# Altium footprint library Selex_PCBLib.PcbLib: 388 footprints (part 1 of 25)
Each footprint in its own frame and in the unit in brackets; x right, y up, seen from the top. Pads: shape width x height; smd on the part's side, far side on the other; paste and mask are expansions set on the pad; w line width, h text height; cw(c..) or ccw(c..) is an arc to the next point about the centre after c.
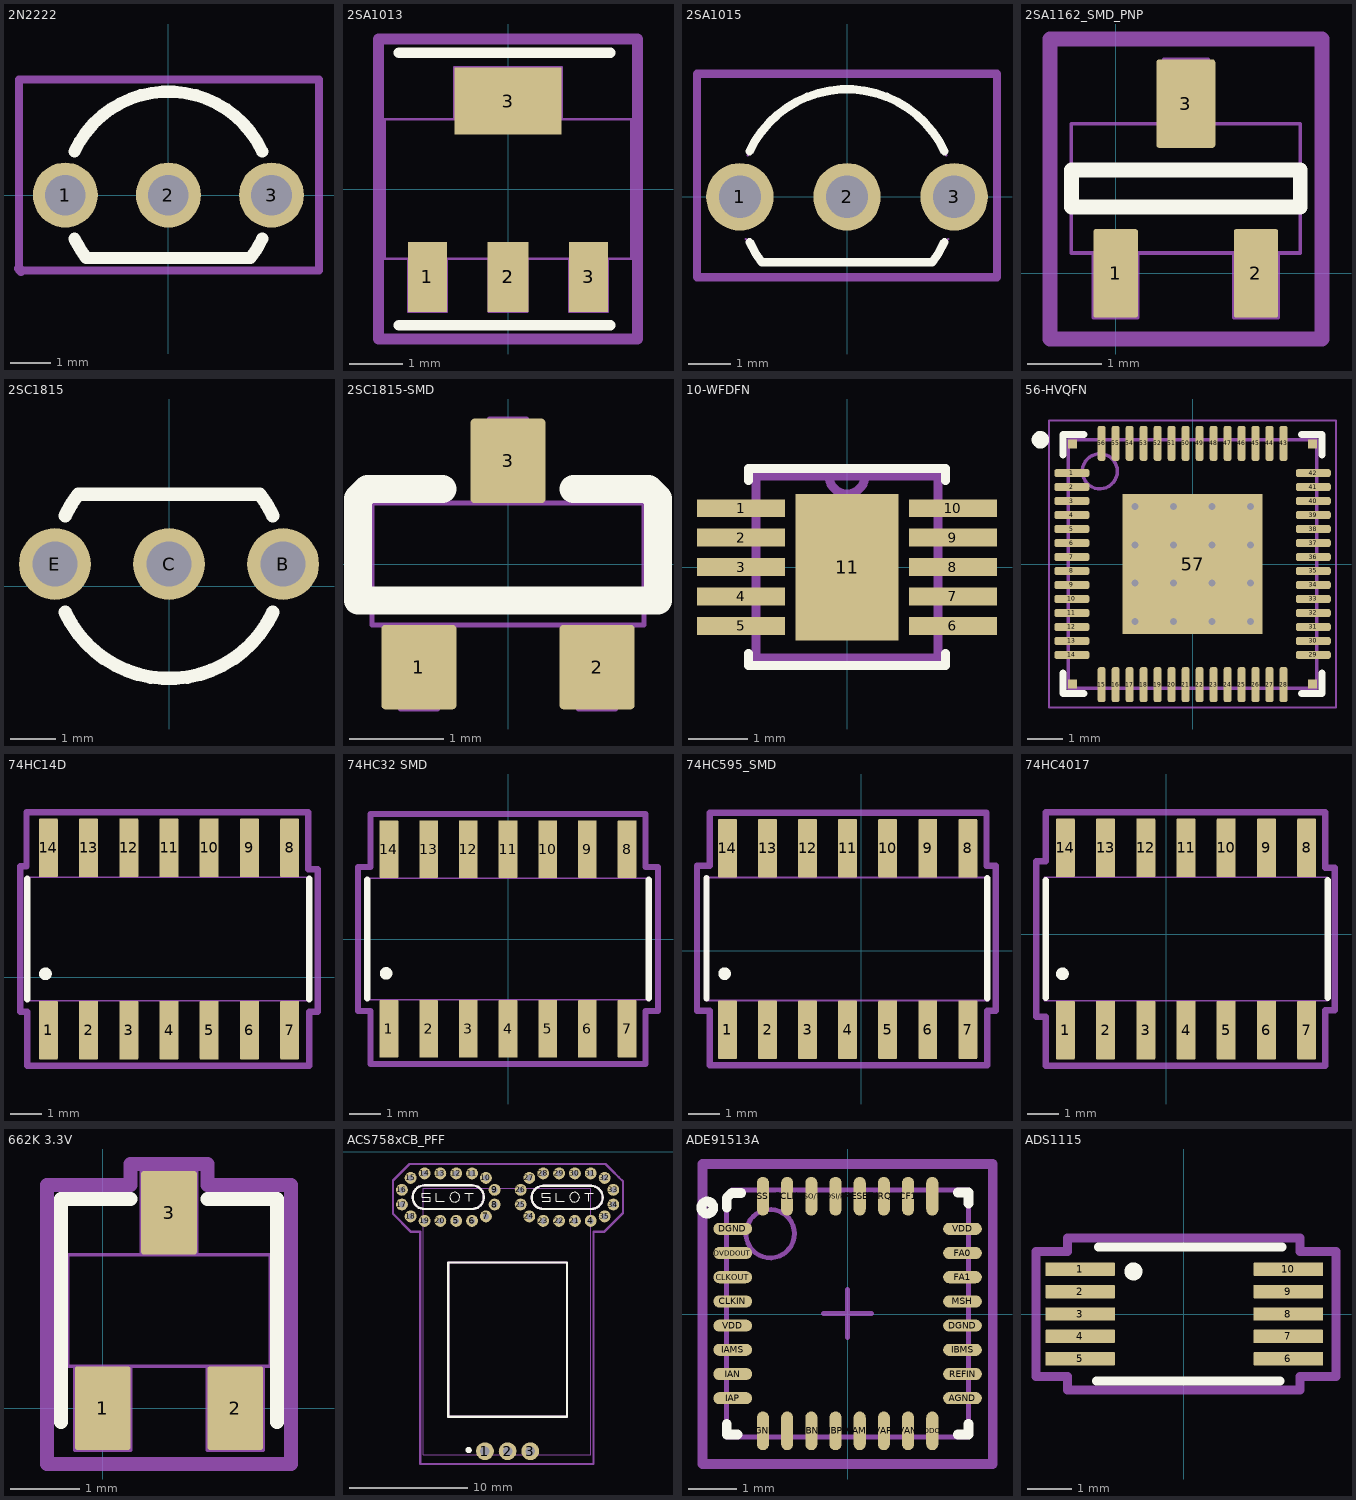
[diagram p0: the footprints below, top view; thin cyan lines are the x and y axes]

## 2N2222 [mm] "NPN transistor"
height 5.33
pads (3):
  round 1.6 hole 1 mask+0.1: 1(-2.54,0) 2(0,0) 3(2.54,0)
Top Overlay:
  lines w0.3: -2.311,-1.078 ccw(c0,0) -2.025,-1.55 2.025,-1.55 ccw(c0,0) 2.311,-1.078 ; -2.311,1.078 cw(c0,0) 2.311,1.078
Mechanical 1:
  circle w0.05: c2.54,0 r0.65
  circle w0.05: c0,0 r0.65
  circle w0.05: c-2.54,0 r0.65
  circle w0.05: c-2.54,0 r0.65
  lines w0.05: -2.4,-1 -2.025,-1.55 2.025,-1.55 2.4,-1 ; -2.354,0.981 cw(c0,0) 2.354,0.981
  text "B" at -0.2,-0.4 h0.8
  text "C" at -2.8,-0.4 h0.8
  text "E" at 2.3,-0.4 h0.8
Mechanical 7:
  lines w0.2: -3.68,-1.81 -3.68,2.85 3.71,2.85 3.71,-1.86 -3.63,-1.86
  lines w0.254: -3.68,-1.81 -3.63,-1.86
3D body "User Library-TO-92_Bent.STEP": height 10, standoff -3, extent -2.79,-1.59 2.79,2.613

## 2SA1013 [mm] "PNP transistor"
height 1.5
pads (5):
  rect 0.72x1.3 smd mask+0.1: 1(-1.5,-1.637) 3(1.5,-1.637)
  rect 0.76x1.3 smd mask+0.1: 2(0,-1.637) 2(0,-1.637)
  rect 2x1.25 smd mask+0.1: 3(0,1.637)
Top Overlay:
  lines w0.2: -2.032,-2.54 1.905,-2.54 ; -2.032,2.54 1.905,2.54
Mechanical 1:
  lines w0.05: -1.86,-1.3 -1.86,-2.288 -1.14,-2.288 -1.14,-1.3 ; -1,1.3 -1,2.262 1,2.262 1,1.3 ; -0.36,-1.3 -0.36,-2.288 0.36,-2.288 0.36,-1.3 ; 1.14,-1.3 1.14,-2.288 1.86,-2.288 1.86,-1.3 ; -2.3,-1.3 2.3,-1.3 2.3,1.3 -2.3,1.3 -2.3,-1.3
  text "B" at -1.9,-0.763 h1.2
  text "C" at -0.4,-0.763 h1.2
  text "E" at 1.1,-0.763 h1.2
Mechanical 15:
  lines w0.2: -2.413,-2.794 2.413,-2.794 2.413,2.794 -2.413,2.794 -2.413,1.111 -2.413,-1.492 -2.413,-2.794
3D body "SOT-89.step": height 1.5, standoff 0, extent -2.25,-1.937 2.25,2.063

## 2SA1015 [mm] "BJT, through"
height 6.5
pads (3):
  round 1.6 hole 1 mask+0.1: 1(-2.54,0) 2(0,0) 3(2.54,0)
Top Overlay:
  lines w0.2: -2.311,-1.078 ccw(c0,0) -2.025,-1.55 2.025,-1.55 ccw(c0,0) 2.311,-1.078 ; -2.311,1.078 cw(c0,0) 2.311,1.078
Mechanical 1:
  circle w0.05: c-2.54,0 r0.65
  circle w0.05: c-2.54,0 r0.65
  circle w0.05: c0,0 r0.65
  circle w0.05: c2.54,0 r0.65
  lines w0.05: -2.4,-1 -2.025,-1.55 2.025,-1.55 2.4,-1 ; -2.354,0.981 cw(c0,0) 2.354,0.981
  text "E" at -2.8,-0.4 h0.8
  text "C" at -0.3,-0.4 h0.8
  text "B" at 2.3,-0.4 h0.8
Mechanical 15:
  lines w0.2: -3.556,-1.905 3.556,-1.905 3.556,2.921 -3.556,2.921 -3.556,-1.905
3D body "User Library-TO-92_Bent.STEP": height 7, standoff -6, extent -2.79,-1.59 2.79,2.613

## 2SA1162_SMD_PNP [mm] "2SA1162,PNP,SMD, TO-236MOD"
height 1.3
pads (3):
  rrect10% 0.6x1.2 smd mask+0.1: 1(0,0) 2(1.9,0)
  rrect10% 0.8x1.2 smd mask+0.1: 3(0.95,2.3)
Top Overlay:
  lines w0.2: -0.6,0.9 -0.6,1.4 2.5,1.4 2.5,0.9 -0.6,0.9
Mechanical 1:
  lines w0.05: -0.6,0.275 -0.6,2.025 2.5,2.025 2.5,0.275 -0.6,0.275 ; -0.3,-0.6 -0.3,0.275 0.3,0.275 0.3,-0.6 -0.3,-0.6 ; 0.65,2.025 1.25,2.025 1.25,2.9 0.65,2.9 0.65,2.025 ; 1.6,-0.6 2.2,-0.6 2.2,0.275 1.6,0.275 1.6,-0.6
  text "E" at 1.591,0.377 h0.8
  text "C" at 0.653,1.083 h0.8
  text "B" at -0.324,0.364 h0.8
Mechanical 15:
  lines w0.2: -0.889,-0.762 -0.889,3.175 2.794,3.175 2.794,-0.889 -0.889,-0.889 -0.889,-0.635
3D body "User Library-SOT95P240X110-3M[SOT23-3_TO-236AB].step": height 1.09, standoff 0, extent -0.552,-0.113 2.448,2.387

## 2SC1815 [mm] "BJT, through"
height 6.5
pads (3):
  round 1.6 hole 1 mask+0.1: B(2.54,0.5) C(0,0.5) E(-2.54,0.5)
Top Overlay:
  lines w0.3: -2.311,-0.578 ccw(c0,0.5) 2.311,-0.578 ; -2.311,1.578 cw(c0,0.5) -2.025,2.05 2.025,2.05 cw(c0,0.5) 2.311,1.578
Mechanical 1:
  circle w0.05: c2.54,0.5 r0.65
  circle w0.05: c2.54,0.5 r0.65
  circle w0.05: c0,0.5 r0.65
  circle w0.05: c-2.54,0.5 r0.65
  lines w0.05: -2.4,1.5 -2.025,2.05 2.025,2.05 2.4,1.5 ; -2.354,-0.481 ccw(c0,0.5) 2.354,-0.481
  text "E" at 2.8,0.9 h0.8
  text "C" at 0.3,0.9 h0.8
  text "B" at -2.3,0.9 h0.8
3D body "User Library-TO-92_Bent.STEP": height 7, standoff -6, extent -2.79,-2.113 2.79,2.09

## 2SC1815-SMD [mm] "NPN-VCE=50V,IC=150mA"
height 1.07
pads (3):
  rrect10% 0.8x0.9 smd mask+0.05: 1(-0.95,-1.1) 2(0.95,-1.1) 3(0,1.1)
Top Overlay:
  lines w0.3: -0.7,0.8 -1.5,0.8 -1.6,0.7 -1.6,-0.39 1.6,-0.39 1.6,0.7 1.5,0.8 0.7,0.8
Mechanical 1:
  lines w0.05: -0.2,0.65 -0.2,1.55 0.2,1.55 0.2,0.65 ; 0.75,-0.65 0.75,-1.55 1.15,-1.55 1.15,-0.65 ; -1.15,-1.55 -1.15,-0.65 -1.15,-1.55 ; -1.15,-1.55 -0.75,-1.55 ; -1.15,-1.55 -0.75,-1.55 ; -0.75,-1.55 -0.75,-0.65 -0.75,-1.55 ; -1.45,-0.65 -1.45,0.65 1.45,0.65 1.45,-0.65 -1.45,-0.65
  text "C" at -0.27,-0.27 h0.8
  text "B" at -1.28,-0.47 h0.8
  text "E" at 0.76,-0.41 h0.8
3D body "User Library-sot-3p290x130ll237h100.step": height 1, standoff 0, extent -1.44,-1.185 1.46,1.185

## 10-WFDFN [mm]
pads (11):
  rect 1.5x0.305 smd: 1(-1.8,1) 2(-1.8,0.5) 3(-1.8,0) 4(-1.8,-0.5) 5(-1.8,-1) 6(1.8,-1) 7(1.8,-0.5) 8(1.8,0) 9(1.8,0.5) 10(1.8,1)
  rect 1.753x2.489 smd paste-2: 11(0,0)
Top Overlay:
  lines w0.152: -1.676,-1.676 1.676,-1.676 ; -1.676,-1.676 -1.676,-1.473 -1.676,-1.676 ; -1.676,-1.676 1.676,-1.676 ; -1.676,1.676 -1.676,1.473 -1.676,1.676 ; -1.676,1.676 1.676,1.676 ; -1.676,1.676 1.676,1.676 ; 1.676,-1.676 1.676,-1.473 1.676,-1.676 ; 1.676,1.676 1.676,1.473 1.676,1.676
Top Paste:
  region: 0.876,-1.245 -0.876,-1.245 -0.876,1.245 0.876,1.245
  region: 0.876,-1.245 -0.876,-1.245 -0.876,1.245 0.876,1.245
Mechanical 13:
  lines w0.152: -1.549,-1.549 -1.549,1.549 ; -1.549,-1.549 1.549,-1.549 ; -1.549,-1.549 1.549,-1.549 ; -1.549,-1.549 -1.549,1.549 ; -1.549,1.549 -0.305,1.549 ; -1.549,1.549 -0.305,1.549 ; -0.305,1.549 ccw(c0,1.549) 0.305,1.549 ; -0.305,1.549 ccw(c0,1.549) 0.305,1.549 ; -0.305,1.549 0.305,1.549 ; -0.305,1.549 0.305,1.549 ; 0.305,1.549 1.549,1.549 ; 0.305,1.549 1.549,1.549 ; 1.549,-1.549 1.549,1.549 ; 1.549,-1.549 1.549,1.549
3D body "LTC3407AEDD#PBF.STEP": height 0.8, standoff 0, extent -1.5,-1.5 1.5,1.5

## 56-HVQFN [mm] "General Purpose PMIC 56-HVQFN (7x7)"
pads (61):
  rrect50% 1x0.22 smd mask+0.05: 1(-3.45,2.6) 2(-3.45,2.2) 3(-3.45,1.8) 4(-3.45,1.4) 5(-3.45,1) 6(-3.45,0.6) 7(-3.45,0.2) 8(-3.45,-0.2) 9(-3.45,-0.6) 10(-3.45,-1) 11(-3.45,-1.4) 12(-3.45,-1.8) 13(-3.45,-2.2) 14(-3.45,-2.6) 29(3.45,-2.6) 30(3.45,-2.2) 31(3.45,-1.8) 32(3.45,-1.4) 33(3.45,-1) 34(3.45,-0.6) 35(3.45,-0.2) 36(3.45,0.2) 37(3.45,0.6) 38(3.45,1) 39(3.45,1.4) 40(3.45,1.8) 41(3.45,2.2) 42(3.45,2.6)
  rrect50% 0.22x1 smd mask+0.05: 15(-2.6,-3.45) 16(-2.2,-3.45) 17(-1.8,-3.45) 18(-1.4,-3.45) 19(-1,-3.45) 20(-0.6,-3.45) 21(-0.2,-3.45) 22(0.2,-3.45) 23(0.6,-3.45) 24(1,-3.45) 25(1.4,-3.45) 26(1.8,-3.45) 27(2.2,-3.45) 28(2.6,-3.45) 43(2.6,3.45) 44(2.2,3.45) 45(1.8,3.45) 46(1.4,3.45) 47(1,3.45) 48(0.6,3.45) 49(0.2,3.45) 50(-0.2,3.45) 51(-0.6,3.45) 52(-1,3.45) 53(-1.4,3.45) 54(-1.8,3.45) 55(-2.2,3.45) 56(-2.6,3.45)
  rect 0.25x0.25 smd mask+0.05: 57(-3.429,-3.429) 57(-3.429,3.429) 57(3.429,-3.429) 57(3.429,3.429)
  rect 4x4 smd mask+0.05: 57(0,0)
via 1.65,-1.65 diameter 0.5 hole 0.2
via 0.55,-1.65 diameter 0.5 hole 0.2
via -0.55,-1.65 diameter 0.5 hole 0.2
via -1.65,-1.65 diameter 0.5 hole 0.2
via 1.65,-0.55 diameter 0.5 hole 0.2
via 0.55,-0.55 diameter 0.5 hole 0.2
via -0.55,-0.55 diameter 0.5 hole 0.2
via -1.65,-0.55 diameter 0.5 hole 0.2
via 1.65,0.55 diameter 0.5 hole 0.2
via 0.55,0.55 diameter 0.5 hole 0.2
via -0.55,0.55 diameter 0.5 hole 0.2
via -1.65,0.55 diameter 0.5 hole 0.2
via 1.65,1.65 diameter 0.5 hole 0.2
via 0.55,1.65 diameter 0.5 hole 0.2
via -0.55,1.65 diameter 0.5 hole 0.2
via -1.65,1.65 diameter 0.5 hole 0.2
Top Overlay:
  circle w0.25: c-4.35,3.55 r0.125
  lines w0.2: -3.7,-3.11 -3.7,-3.7 -3.11,-3.7 ; -3.7,3.11 -3.7,3.7 -3.11,3.7 ; 3.11,-3.7 3.7,-3.7 3.7,-3.11 ; 3.11,3.7 3.7,3.7 3.7,3.11
Bottom Courtyard:
  text ".Comment" at -2.024,-0.055 h1.02
Top Component Outline:
  lines w0.05: -4.1,-4.1 4.1,-4.1 4.1,4.1 -4.1,4.1 -4.1,-4.1
  lines w0.1: -0.5,0 0.5,0 ; 0,-0.5 0,0.5
Top Designator:
  text ".Designator" at -1.815,-0.158 h0.7
Top Assembly:
  circle w0.1: c-2.65,2.65 r0.5
  lines w0.1: -3.55,-3.55 3.55,-3.55 3.55,3.55 -3.55,3.55 -3.55,-3.55
3D body "QFN40P700X700X100_HS-57N.step": height 1, standoff 0, extent -3.551,-3.551 3.551,3.551

## 74HC14D [mm] "74HC14, SO14, SMD."
height 1.75
pads (14):
  rrect10% 0.6x1.85 smd mask+0.05: 1(11.565,-1.675) 2(12.835,-1.675) 3(14.105,-1.675) 4(15.375,-1.675) 5(16.645,-1.675) 6(17.915,-1.675) 7(19.185,-1.675) 8(19.185,4.075) 9(17.915,4.075) 10(16.645,4.075) 11(15.375,4.075) 12(14.105,4.075) 13(12.835,4.075) 14(11.565,4.075)
Top Overlay:
  circle w0.2: c11.475,0.1 r0.1
  lines w0.2: 10.9,-0.7 10.9,3.1 ; 19.8,-0.7 19.8,3.1
Mechanical 1:
  lines w0.05: 10.9,-0.75 10.9,3.15 19.85,3.15 19.85,-0.75 10.9,-0.75
Mechanical 3:
  lines w0.2: 10.675,0.5 10.675,3.5 ; 10.675,3.5 10.875,3.5 10.875,5.2 19.775,5.2 19.775,3.4 20.075,3.4 20.075,-1.1 19.8,-1.1 19.8,-2.8 10.9,-2.8 10.9,-1.1 10.675,-1.1 10.675,3.5
3D body "User Library-SOIC14-150.step": height 1.75, standoff 0, extent 11.1,-1.6 19.65,4.2

## 74HC32 SMD [mm] "Quad 2-input OR Gate, SOIC14"
height 1.75
pads (14):
  rrect10% 0.6x1.85 smd mask+0.05: 1(-3.81,-2.875) 2(-2.54,-2.875) 3(-1.27,-2.875) 4(0,-2.875) 5(1.27,-2.875) 6(2.54,-2.875) 7(3.81,-2.875) 8(3.81,2.875) 9(2.54,2.875) 10(1.27,2.875) 11(0,2.875) 12(-1.27,2.875) 13(-2.54,2.875) 14(-3.81,2.875)
Top Overlay:
  circle w0.2: c-3.9,-1.1 r0.1
  lines w0.2: -4.5,-1.9 -4.5,1.9 ; 4.5,-1.9 4.5,1.9
Mechanical 1:
  lines w0.05: -4.475,-1.95 -4.475,1.95 4.475,1.95 4.475,-1.95 -4.475,-1.95
Mechanical 3:
  lines w0.2: -4.8,-2.3 -4.4,-2.3 -4.4,-4 4.4,-4 4.4,-2.3 4.8,-2.3 4.8,2.3 4.4,2.3 4.4,4 -4.4,4 -4.4,2.3 -4.8,2.3 -4.8,-2.3
3D body "User Library-SOIC14-150.step": height 1.75, standoff 0, extent -4.275,-2.8 4.275,3

## 74HC595_SMD [mm] "SOI-16,SMD"
height 1.7
pads (14):
  rrect10% 0.6x1.85 smd mask+0.05: 1(-4.235,-2.5) 2(-2.965,-2.5) 3(-1.695,-2.5) 4(-0.425,-2.5) 5(0.845,-2.5) 6(2.115,-2.5) 7(3.385,-2.5) 8(3.385,3.25) 9(2.115,3.25) 10(0.845,3.25) 11(-0.425,3.25) 12(-1.695,3.25) 13(-2.965,3.25) 14(-4.235,3.25)
Top Overlay:
  circle w0.2: c-4.325,-0.725 r0.1
  lines w0.2: -4.9,-1.5 -4.9,2.3 ; 4,-1.5 4,2.3
Mechanical 1:
  lines w0.05: -4.9,-1.575 4.05,-1.575 4.05,2.325 -4.9,2.325 -4.9,-1.575
Mechanical 3:
  lines w0.2: -5.2,-1.9 -5.2,2.7 -4.8,2.7 -4.8,4.375 3.975,4.375 3.975,2.7 4.275,2.7 4.275,-1.9 4,-1.9 4,-3.625 -4.8,-3.625 -4.8,-1.9 -5.2,-1.9
3D body "User Library-SOIC14-150.step": height 1.75, standoff 0, extent -4.7,-2.425 3.85,3.375

## 74HC4017 [mm] "SO16-SOT109-1"
height 1.75
pads (14):
  rrect10% 0.6x1.85 smd mask+0.05: 1(-3.185,-3.025) 2(-1.915,-3.025) 3(-0.645,-3.025) 4(0.625,-3.025) 5(1.895,-3.025) 6(3.165,-3.025) 7(4.435,-3.025) 8(4.435,2.725) 9(3.165,2.725) 10(1.895,2.725) 11(0.625,2.725) 12(-0.645,2.725) 13(-1.915,2.725) 14(-3.185,2.725)
Top Overlay:
  circle w0.2: c-3.275,-1.25 r0.1
  lines w0.2: -3.8,-2 -3.8,1.7 ; 5.1,-2 5.1,1.7
Mechanical 1:
  lines w0.05: -3.85,-2.1 -3.85,1.8 5.1,1.8 5.1,-2.1 -3.85,-2.1
Mechanical 3:
  lines w0.2: -4.1,2.3 -4.1,-1.606 -4.1,-2.6 -3.8,-2.6 -3.8,-4.15 5.025,-4.15 5.025,-2.4 5.325,-2.4 5.325,2.1 5.025,2.1 5.025,3.85 -3.8,3.85 -3.8,2.3 -4.075,2.3
3D body "User Library-SOIC14-150.step": height 1.75, standoff 0, extent -3.65,-2.95 4.9,2.85

## 662K 3.3V [mm] "3.3V 0.5A SOT-23"
height 1.3
pads (3):
  rrect10% 0.8x1.2 smd mask+0.05: 1(0,0) 2(1.9,0) 3(0.95,2.8)
Top Overlay:
  lines w0.2: -0.6,-0.2 -0.6,3 0.4,3 ; 1.5,3 2.5,3 2.5,-0.2
Mechanical 1:
  lines w0.05: -0.4,0.6 -0.4,-0.6 0.4,-0.6 0.4,0.6 ; 0.55,2.2 0.55,3.4 1.35,3.4 1.35,2.2 ; 1.5,0.6 1.5,-0.6 2.3,-0.6 2.3,0.6 ; -0.5,0.6 -0.5,2.2 2.4,2.2 2.4,0.6 -0.5,0.6
Mechanical 3:
  lines w0.2: -0.8,-0.8 2.7,-0.8 2.7,-0.4 2.7,3.2 1.5,3.2 1.5,3.5 0.4,3.5 0.4,3.2 -0.8,3.2 -0.8,-0.4 -0.8,-0.8
3D body "User Library-sot-3p290x130ll237h100.step": height 1, standoff 0, extent -0.49,0.065 2.41,2.435

## ACS758xCB_PFF [mm]
pads (35):
  round 1.5 hole 0.8: 1(28.824,-25.21) 2(30.734,-25.21) 3(32.644,-25.21)
  round 1 hole 0.5: 4(37.734,-5.81) 5(26.401,-5.81) 6(27.734,-5.81) 7(28.91,-5.428) 8(29.636,-4.428) 9(29.636,-3.192) 10(28.91,-2.192) 11(27.734,-1.81) 12(26.401,-1.81) 13(25.067,-1.81) 14(23.734,-1.81) 15(22.558,-2.192) 16(21.832,-3.192) 17(21.832,-4.428) 18(22.558,-5.428) 19(23.734,-5.81) 20(25.067,-5.81) 21(36.401,-5.81) 22(35.067,-5.81) 23(33.734,-5.81) 24(32.558,-5.428) 25(31.832,-4.428) 26(31.832,-3.192) 27(32.558,-2.192) 28(33.734,-1.81) 29(35.067,-1.81) 30(36.401,-1.81) 31(37.734,-1.81) 32(38.91,-2.192) 33(39.636,-3.192) 34(39.636,-4.428) 35(38.91,-5.428)
Top Overlay:
  circle w0.1: c36.383,-3.81 r0.41
  circle w0.1: c26.285,-3.81 r0.41
  circle w0.254: c27.449,-25.113 r0.139
  lines w0.1: 23.535,-4.16 24.235,-4.16 24.235,-3.81 23.535,-3.81 23.535,-3.46 24.235,-3.46 ; 24.735,-3.476 24.735,-4.16 25.403,-4.16 ; 27.135,-3.46 27.835,-3.46 ; 27.485,-4.16 27.485,-3.46 ; 33.633,-4.16 34.333,-4.16 34.333,-3.81 33.633,-3.81 33.633,-3.46 34.333,-3.46 ; 34.833,-3.476 34.833,-4.16 35.501,-4.16 ; 37.233,-3.46 37.933,-3.46 ; 37.583,-4.16 37.583,-3.46
  lines w0.2: 23.734,-4.81 cw(c23.734,-3.81) 23.734,-2.81 27.734,-2.81 cw(c27.734,-3.81) 27.734,-4.81 23.734,-4.81 ; 25.734,-22.31 25.734,-9.31 35.734,-9.31 35.734,-22.31 25.734,-22.31 ; 33.734,-4.81 cw(c33.734,-3.832) 33.734,-2.855 37.791,-2.855 cw(c37.762,-3.832) 37.791,-4.81 33.734,-4.81
Mechanical 13:
  lines w0.1: 23.622,-25.527 23.622,-3.048 37.719,-3.048 37.719,-25.527 23.622,-25.527
  lines w0.2: 23.734,-4.81 cw(c23.734,-3.81) 23.734,-2.81 27.734,-2.81 cw(c27.734,-3.81) 27.734,-4.81 23.734,-4.81 ; 25.734,-22.31 25.734,-9.31 35.734,-9.31 35.734,-22.31 25.734,-22.31 ; 33.734,-4.81 cw(c33.734,-3.832) 33.734,-2.855 37.791,-2.855 cw(c37.762,-3.832) 37.791,-4.81 33.734,-4.81
Mechanical 15:
  lines w0.2: 21.082,-5.207 22.606,-6.731 23.368,-6.731 23.368,-8.128 23.368,-26.289 37.973,-26.289 37.973,-8.001 37.973,-7.62 37.973,-6.731 38.862,-6.731 39.688,-5.905 40.45,-5.143 40.45,-4.334 40.45,-3.238 40.45,-2.73 40.45,-2.476 40.1,-2.127 39.529,-1.556 39.243,-1.27 38.989,-1.016 22.479,-1.016 21.082,-2.413 21.082,-5.207
3D body "User Library-ACS758xCB-PFF.STEP": height 7, standoff -3.48, extent 23.655,-25.51 37.655,-3.1

## ADE91513A [mm]
pads (32):
  oval 0.25x0.8 smd: AGND(-1.75,-2.415) AVDDOUT(1.75,-2.415) CF1(1.25,2.435) IBN(-0.75,-2.415) IBP(-0.25,-2.415) IRQ(0.75,2.435) MISO/TX(-0.75,2.435) MOSI/RX(-0.25,2.435) RESET(0.25,2.435) SCLK(-1.25,2.435) SS(-1.75,2.435) VAMS(0.25,-2.415) VAN(1.25,-2.415) VAP(0.75,-2.415) VDDOUT2P5(-1.25,-2.415) ZX/DREADY/CF2(1.75,2.435)
  oval 0.8x0.25 smd: AGND(2.375,-1.74) CLKIN(-2.375,0.26) CLKOUT(-2.375,0.76) DGND(-2.375,1.76) DGND(2.375,-0.24) DVDDOUT(-2.375,1.26) FA0(2.375,1.26) FA1(2.375,0.76) IAMS(-2.375,-0.74) IAN(-2.375,-1.24) IAP(-2.375,-1.74) IBMS(2.375,-0.74) MSH(2.375,0.26) REFIN(2.375,-1.24) VDD(-2.375,-0.24) VDD(2.375,1.76)
Top Overlay:
  circle w0.2: c-2.9,2.2 r0.125
  lines w0.2: -2.5,-2.265 -2.5,-2.49 -2.275,-2.49 ; -2.5,2.2 -2.5,2.397 -2.397,2.5 -2.2,2.5 ; 2.275,-2.49 2.5,-2.49 2.5,-2.265 ; 2.275,2.51 2.5,2.51 2.5,2.285
Mechanical 13:
  circle w0.1: c-1.6,1.66 r0.5
  lines w0.1: -2.5,-2.54 2.5,-2.54 2.5,2.56 -2.387,2.56 -2.5,2.447 -2.5,-2.54
Mechanical 15:
  lines w0.1: -0.5,0.01 0.5,0.01 ; 0,-0.49 0,0.51
  lines w0.2: -3,-3.1 3,-3.1 3,3.1 -3,3.1 -3,-3.1
3D body: height 0.8, standoff 0, extent -2.5,-2.54 2.5,2.56

## ADS1115 [mm]
pads (10):
  rrect10% 1.55x0.3 smd mask+0.05: 1(-2.315,1) 2(-2.315,0.5) 3(-2.315,0) 4(-2.315,-0.5) 5(-2.315,-1) 6(2.335,-1) 7(2.335,-0.5) 8(2.335,0) 9(2.335,0.5) 10(2.335,1)
Top Overlay:
  circle w0.2: c-1.125,0.95 r0.1
  lines w0.2: -1.95,-1.5 2.15,-1.5 ; -1.9,1.5 2.2,1.5
Mechanical 3:
  lines w0.2: -3.3,-1.4 -3.3,1.4 -2.6,1.4 -2.6,1.7 2.6,1.7 2.6,1.4 3.4,1.4 3.4,-1.4 2.6,-1.4 2.6,-1.7 -2.6,-1.7 -2.6,-1.4 -3.3,-1.4
3D body "DGS0010A.stp": height 1.11, standoff 0.01, extent -2.44,-1.476 2.485,1.524